# Altium footprint library sun_library.PcbLib: 412 footprints (part 17 of 26)
Each footprint in its own frame and in the unit in brackets; x right, y up, seen from the top. Pads: shape width x height; smd on the part's side, far side on the other; paste and mask are expansions set on the pad; w line width, h text height; cw(c..) or ccw(c..) is an arc to the next point about the centre after c.
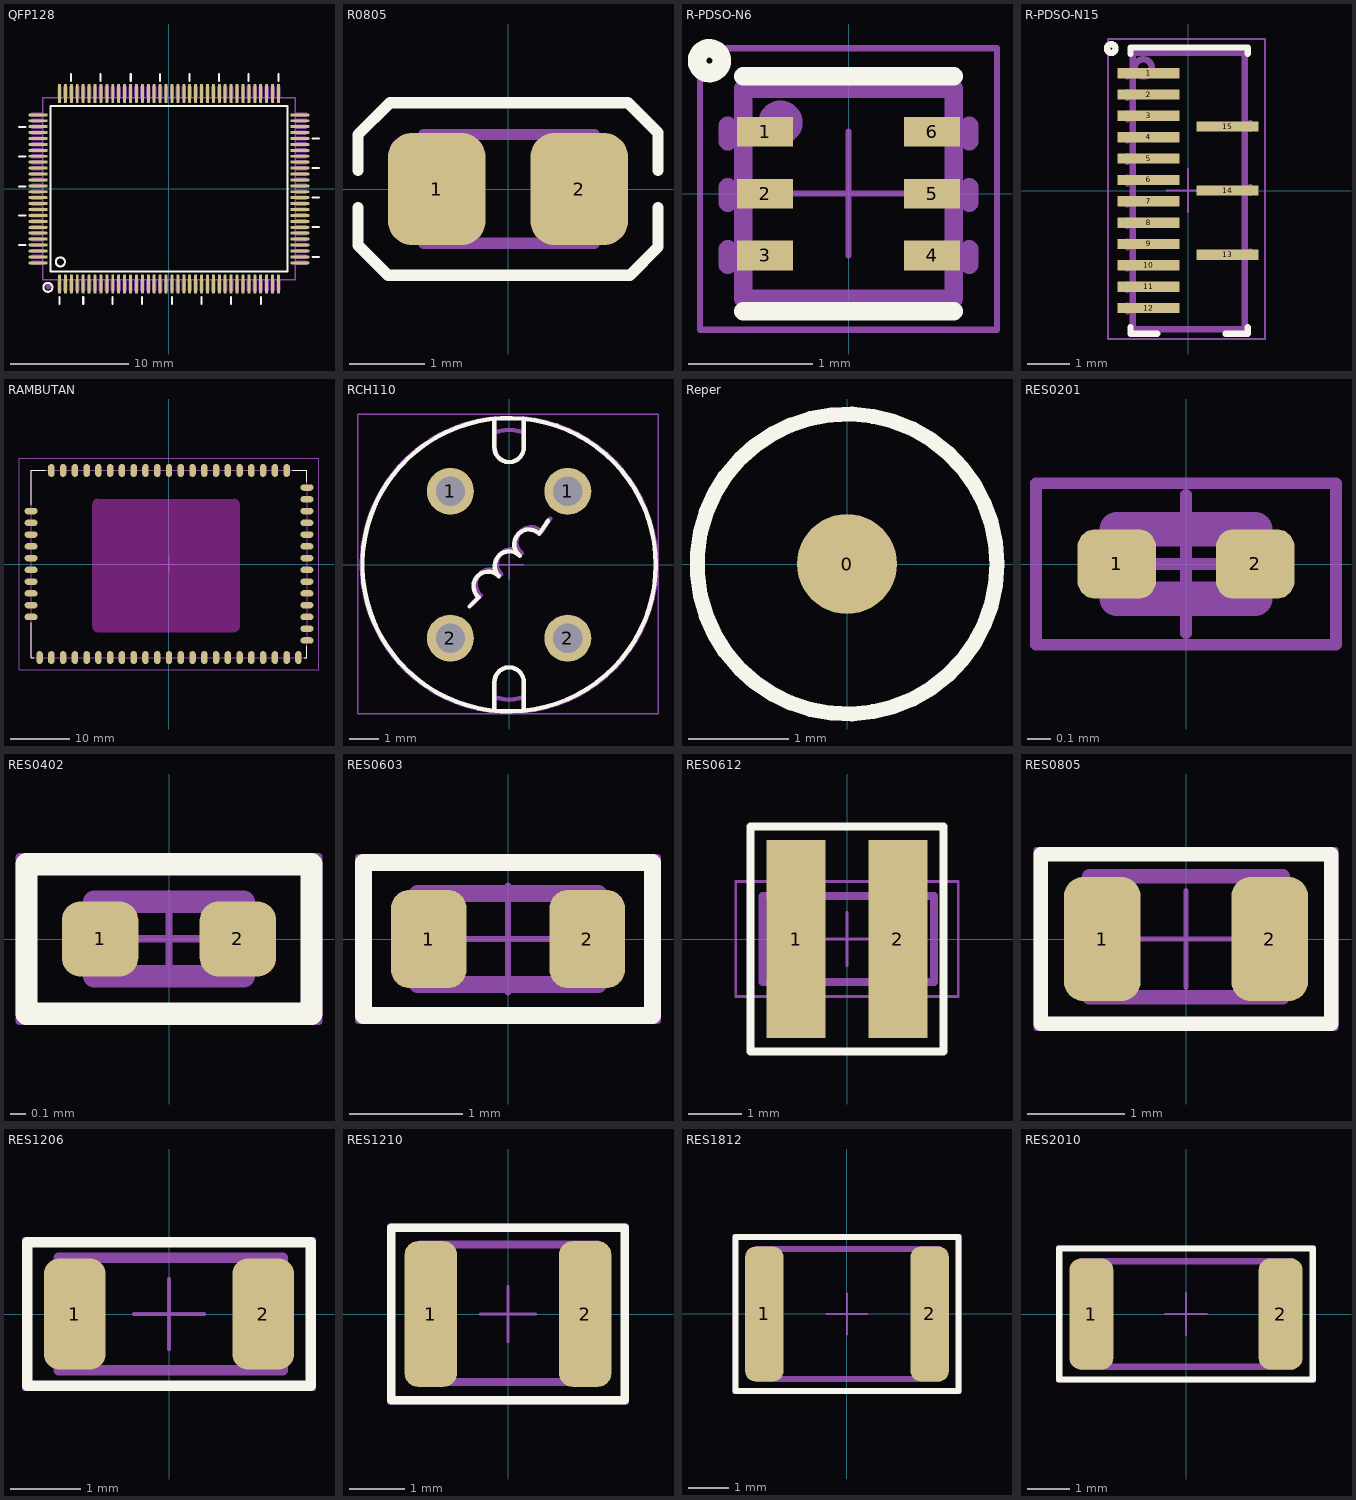
[diagram p16: the footprints below, top view; thin cyan lines are the x and y axes]

## QFP128 [mm]
pads (128):
  rrect50% 0.25x1.6 smd mask+0.075: 1(-9.25,-8.05) 2(-8.75,-8.05) 3(-8.25,-8.05) 4(-7.75,-8.05) 5(-7.25,-8.05) 6(-6.75,-8.05) 7(-6.25,-8.05) 8(-5.75,-8.05) 9(-5.25,-8.05) 10(-4.75,-8.05) 11(-4.25,-8.05) 12(-3.75,-8.05) 13(-3.25,-8.05) 14(-2.75,-8.05) 15(-2.25,-8.05) 16(-1.75,-8.05) 17(-1.25,-8.05) 18(-0.75,-8.05) 19(-0.25,-8.05) 20(0.25,-8.05) 21(0.75,-8.05) 22(1.25,-8.05) 23(1.75,-8.05) 24(2.25,-8.05) 25(2.75,-8.05) 26(3.25,-8.05) 27(3.75,-8.05) 28(4.25,-8.05) 29(4.75,-8.05) 30(5.25,-8.05) 31(5.75,-8.05) 32(6.25,-8.05) 33(6.75,-8.05) 34(7.25,-8.05) 35(7.75,-8.05) 36(8.25,-8.05) 37(8.75,-8.05) 38(9.25,-8.05) 65(9.25,8.05) 66(8.75,8.05) 67(8.25,8.05) 68(7.75,8.05) 69(7.25,8.05) 70(6.75,8.05) 71(6.25,8.05) 72(5.75,8.05) 73(5.25,8.05) 74(4.75,8.05) 75(4.25,8.05) 76(3.75,8.05) 77(3.25,8.05) 78(2.75,8.05) 79(2.25,8.05) 80(1.75,8.05) 81(1.25,8.05) 82(0.75,8.05) 83(0.25,8.05) 84(-0.25,8.05) 85(-0.75,8.05) 86(-1.25,8.05) 87(-1.75,8.05) 88(-2.25,8.05) 89(-2.75,8.05) 90(-3.25,8.05) 91(-3.75,8.05) 92(-4.25,8.05) 93(-4.75,8.05) 94(-5.25,8.05) 95(-5.75,8.05) 96(-6.25,8.05) 97(-6.75,8.05) 98(-7.25,8.05) 99(-7.75,8.05) 100(-8.25,8.05) 101(-8.75,8.05) 102(-9.25,8.05)
  rrect50% 1.6x0.25 smd mask+0.075: 39(11.05,-6.25) 40(11.05,-5.75) 41(11.05,-5.25) 42(11.05,-4.75) 43(11.05,-4.25) 44(11.05,-3.75) 45(11.05,-3.25) 46(11.05,-2.75) 47(11.05,-2.25) 48(11.05,-1.75) 49(11.05,-1.25) 50(11.05,-0.75) 51(11.05,-0.25) 52(11.05,0.25) 53(11.05,0.75) 54(11.05,1.25) 55(11.05,1.75) 56(11.05,2.25) 57(11.05,2.75) 58(11.05,3.25) 59(11.05,3.75) 60(11.05,4.25) 61(11.05,4.75) 62(11.05,5.25) 63(11.05,5.75) 64(11.05,6.25) 103(-11.05,6.25) 104(-11.05,5.75) 105(-11.05,5.25) 106(-11.05,4.75) 107(-11.05,4.25) 108(-11.05,3.75) 109(-11.05,3.25) 110(-11.05,2.75) 111(-11.05,2.25) 112(-11.05,1.75) 113(-11.05,1.25) 114(-11.05,0.75) 115(-11.05,0.25) 116(-11.05,-0.25) 117(-11.05,-0.75) 118(-11.05,-1.25) 119(-11.05,-1.75) 120(-11.05,-2.25) 121(-11.05,-2.75) 122(-11.05,-3.25) 123(-11.05,-3.75) 124(-11.05,-4.25) 125(-11.05,-4.75) 126(-11.05,-5.25) 127(-11.05,-5.75) 128(-11.05,-6.25)
Top Overlay:
  circle w0.178: c-10.23,-8.322 r0.381
  circle w0.178: c-9.175,-6.175 r0.381
  lines w0.178: -12.671,-4.734 -12.137,-4.734 ; -12.671,-2.245 -12.137,-2.245 ; -12.671,0.194 -12.137,0.194 ; -12.671,2.734 -12.137,2.734 ; -12.671,5.223 -12.137,5.223 ; -9.25,-9.728 -9.25,-9.144 ; -8.285,9.111 -8.285,9.696 ; -7.243,-9.728 -7.243,-9.144 ; -5.77,9.111 -5.77,9.696 ; -4.779,-9.728 -4.779,-9.144 ; -3.23,9.111 -3.23,9.696 ; -2.265,-9.728 -2.265,-9.144 ; -0.766,9.111 -0.766,9.696 ; 0.25,-9.728 0.25,-9.144 ; 1.748,9.111 1.748,9.696 ; 2.739,-9.728 2.739,-9.144 ; 4.212,9.111 4.212,9.696 ; 5.228,-9.728 5.228,-9.144 ; 6.727,9.111 6.727,9.696 ; 7.768,-9.728 7.768,-9.144 ; 9.241,9.111 9.241,9.696 ; 12.14,-5.75 12.673,-5.75 ; 12.14,-3.236 12.673,-3.236 ; 12.14,-0.746 12.673,-0.746 ; 12.14,1.768 12.673,1.768 ; 12.14,4.257 12.673,4.257 ; -10,-7 10,-7 10,7 -10,7 -10,-7
TopAssy 13:
  drawing of 518 lines, arcs and shapes, not listed
3D body "SW3dPS-PQFP128.STEP": height 2.82, standoff -0.06, extent -11.601,-8.601 11.601,8.601

## R0805 [mm]
pads (2):
  rrect50% 1.3x1.5 smd: 1(-0.95,0) 2(0.95,0)
Top Overlay:
  lines w0.15: -2,-0.25 -2,-0.75 -1.6,-1.15 0.4,-1.15 1.625,-1.15 2,-0.775 2,-0.25 ; -2,0.25 -2,0.725 -1.575,1.15 0.4,1.15 1.6,1.15 2,0.75 2,0.25
TopAssy 13:
  rectangle: -1.125,-0.725 -0.6,0.725
  rectangle: 0.625,-0.725 1.15,0.725
  lines w0.15: -1.125,-0.725 -1.125,0.725 1.15,0.725 1.15,-0.725 -1.125,-0.725

## R-PDSO-N6 [mm] "SON, 6-Leads, Body 1,6x1,2mm, Pitch 0,50mm"
height 0.55
pads (6):
  rect 0.45x0.24 smd mask+0.075: 1(-0.675,0.5) 2(-0.675,0) 3(-0.675,-0.5) 4(0.675,-0.5) 5(0.675,0) 6(0.675,0.5)
Top Overlay:
  circle w0.15: c-1.125,1.075 r0.1
  lines w0.15: -0.85,-0.95 0.85,-0.95 ; -0.85,0.95 0.85,0.95
TopAssy 13:
  circle w0.15: c-0.55,0.575 r0.103
  lines w0.15: -0.975,-0.575 -0.975,-0.45 ; -0.975,-0.075 -0.975,0.05 ; -0.975,0.425 -0.975,0.55 ; 0.975,-0.575 0.975,-0.45 ; 0.975,-0.075 0.975,0.05 ; 0.975,0.425 0.975,0.55 ; -0.85,-0.85 0.85,-0.85 0.85,0.85 -0.85,0.85 -0.85,-0.85
CourtTop 15:
  lines w0.05: -0.5,0 0.5,0 ; 0,-0.5 0,0.5 ; -1.2,-1.1 1.2,-1.1 1.2,1.175 -1.2,1.175 -1.2,-1.1
3D body "User Library-R-PDSO-N6.step": height 0.6, standoff 0, extent -0.85,-0.85 0.85,0.85

## R-PDSO-N15 [mm] "SON, 15-Leads, Body 6,5x2,5mm, Pitch 0,50mm"
height 0.75
pads (15):
  rect 1.45x0.24 smd mask+0.075: 1(-0.925,2.75) 2(-0.925,2.25) 3(-0.925,1.75) 4(-0.925,1.25) 5(-0.925,0.75) 6(-0.925,0.25) 7(-0.925,-0.25) 8(-0.925,-0.75) 9(-0.925,-1.25) 10(-0.925,-1.75) 11(-0.925,-2.25) 12(-0.925,-2.75) 13(0.925,-1.5) 14(0.925,0) 15(0.925,1.5)
Top Overlay:
  circle w0.15: c-1.8,3.325 r0.1
  lines w0.15: -1.35,-3.2 -1.35,-3.35 -0.725,-3.35 ; -1.35,3.2 -1.35,3.35 1.4,3.35 1.4,3.2 ; 0.875,-3.35 1.4,-3.35 1.4,-3.2
TopAssy 13:
  circle w0.15: c-1.05,2.875 r0.2
  lines w0.15: -1.425,-2.825 -1.425,-2.7 ; -1.425,-2.325 -1.425,-2.2 ; -1.425,-1.825 -1.425,-1.7 ; -1.425,-1.325 -1.425,-1.2 ; -1.425,-0.825 -1.425,-0.7 ; -1.425,-0.325 -1.425,-0.2 ; -1.425,0.175 -1.425,0.3 ; -1.425,0.675 -1.425,0.8 ; -1.425,1.175 -1.425,1.3 ; -1.425,1.675 -1.425,1.8 ; -1.425,2.175 -1.425,2.3 ; -1.425,2.675 -1.425,2.8 ; 1.45,-1.55 1.45,-1.425 ; 1.45,-0.05 1.45,0.075 ; 1.45,1.45 1.45,1.575 ; -1.3,-3.25 -1.3,3.225 1.325,3.225 1.325,-3.25 -1.3,-3.25
CourtTop 15:
  lines w0.05: -0.5,0 0.5,0 ; 0,-0.5 0,0.5 ; -1.875,-3.475 -1.875,3.55 1.8,3.55 1.8,-3.475 -1.875,-3.475
3D body "User Library-R-PDSO-N15.STEP": height 0.81, standoff 0, extent -1.275,-3.25 1.325,3.25

## RAMBUTAN [mm]
pads (68):
  rrect100% 1.1x2.2 smd paste+0.05: 1(-22,-15.9) 2(-20,-15.9) 3(-18,-15.9) 4(-16,-15.9) 5(-14,-15.9) 6(-12,-15.9) 7(-10,-15.9) 8(-8,-15.9) 9(-6,-15.9) 10(-4,-15.9) 11(-2,-15.9) 12(0,-15.9) 13(2,-15.9) 14(4,-15.9) 15(6,-15.9) 16(8,-15.9) 17(10,-15.9) 18(12,-15.9) 19(14,-15.9) 20(16,-15.9) 21(18,-15.9) 22(20,-15.9) 23(22,-15.9) 38(20,15.9) 39(18,15.9) 40(16,15.9) 41(14,15.9) 42(12,15.9) 43(10,15.9) 44(8,15.9) 45(6,15.9) 46(4,15.9) 47(2,15.9) 48(0,15.9) 49(-2,15.9) 50(-4,15.9) 51(-6,15.9) 52(-8,15.9) 53(-10,15.9) 54(-12,15.9) 55(-14,15.9) 56(-16,15.9) 57(-18,15.9) 58(-20,15.9)
  rrect100% 2.2x1.1 smd paste+0.05: 24(23.45,-13) 25(23.45,-11) 26(23.45,-9) 27(23.45,-7) 28(23.45,-5) 29(23.45,-3) 30(23.45,-1) 31(23.45,1) 32(23.45,3) 33(23.45,5) 34(23.45,7) 35(23.45,9) 36(23.45,11) 37(23.45,13) 59(-23.45,9) 60(-23.45,7) 61(-23.45,5) 62(-23.45,3) 63(-23.45,1) 64(-23.45,-1) 65(-23.45,-3) 66(-23.45,-5) 67(-23.45,-7) 68(-23.45,-9)
Top Overlay:
  lines w0.1: -23.449,-10 -23.449,-15.903 -23,-15.903 ; -23.449,10.051 -23.449,15.933 -21,15.933 ; 21,15.933 23.455,15.933 23.455,14 ; 23,-15.903 23.455,-15.903 23.455,-14
Top Paste:
  drawing of 72 lines, arcs and shapes, not listed
Keep-Out Layer:
  board cut-out: -13,-10.5 -13,10 -13,10.098 -12.962,10.292 -12.886,10.474 -12.777,10.637 -12.637,10.777 -12.474,10.886 -12.292,10.962 -12.098,11 -12,11 11,11 11.098,11 11.292,10.962 11.474,10.886 11.637,10.777 11.777,10.637 11.886,10.474 11.962,10.292 12,10.098 12,10 12,-10.5 12,-10.598 11.962,-10.792 11.886,-10.974 11.777,-11.137 11.637,-11.277 11.474,-11.386 11.292,-11.462 11.098,-11.5 11,-11.5 -12,-11.5 -12.098,-11.5 -12.292,-11.462 -12.474,-11.386 -12.637,-11.277 -12.777,-11.137 -12.886,-10.974 -12.962,-10.792 -13,-10.598
Keep-Out Layer:
  lines w0.15: -13,-10.633 -13,10.001 ; -13,-10.608 ccw(c-12.153,-10.633) -12.033,-11.473 ; -12.992,10.001 cw(c-12.125,10.125) -12.098,11 11,11 ; -12.098,-11.481 11.127,-11.481 ; -12.031,-11.472 -12.001,-11.468 ; 11.001,10.992 cw(c11.125,10.125) 12,10.098 12,-10.482 ; 11.1,-11.481 ccw(c11.127,-10.606) 11.993,-10.482
TopAssy 13:
  drawing of 3590 lines, arcs and shapes, not listed
CourtTop 15:
  lines w0.05: 0,-1.5 0,1.5 0,0 ; 0,0 1.5,0 -1.5,0 0,0 ; -25.5,-18 25.5,-18 25.5,18 -25.5,18 -25.5,-18
3D body "Rambutan.STEP": height 3.52, standoff -0.9, extent -23.45,-15.9 23.45,15.9

## RCH110 [mm]
pads (4):
  round 1.6 hole 1: 1(-2,2.5) 1(2,2.5) 2(-2,-2.5) 2(2,-2.5)
Top Overlay:
  circle w0.15: c0,0 r5
  lines w0.15: -1.351,-1.424 -1.04,-1.114 ; -1.066,-1.089 cw(c-0.713,-0.736) -0.359,-0.382 ; -0.5,-4.9 -0.5,-4 cw(c0,-4) 0.5,-4 0.5,-4.9 ; -0.5,4.9 -0.5,4 ccw(c0,4) 0.5,4 0.5,4.9 ; -0.345,-0.397 cw(c0.009,-0.044) 0.362,0.31 ; 0.321,0.346 cw(c0.675,0.7) 1.029,1.054 1.164,1.256 1.163,1.258 1.325,1.5
TopAssy 13:
  lines w0.15: -1.276,-1.349 -0.965,-1.039 ; -0.991,-1.014 cw(c-0.638,-0.661) -0.284,-0.307 ; -0.5,-5 -0.5,-4 cw(c0,-4) 0.5,-4 0.5,-5 ; -0.5,5 -0.5,4 ccw(c0,4) 0.5,4 0.5,5 ; -0.499,-5 cw(c0,0) -0.499,5 ; -0.5,-4.5 ccw(c0,-3.3) 0.502,-4.499 ; -0.5,4.5 cw(c0,3.3) 0.502,4.499 ; -0.27,-0.322 cw(c0.084,0.031) 0.437,0.385 ; 0.396,0.421 cw(c0.75,0.775) 1.104,1.129 1.239,1.331 1.238,1.333 1.4,1.575 ; 0.508,-4.999 ccw(c0,0) 0.508,4.999
CourtTop 15:
  lines w0.05: -0.5,0 0.5,0 ; 0,-0.5 0,0.5 ; -5.15,-5.075 -5.15,5.125 5.075,5.125 5.075,-5.075 -5.15,-5.075
3D body "Coilcraft-RFB0807.step": height 7.5, standoff -3.5, extent -6.223,-6.523 6.223,5.922

## Reper [mm]
pads (1):
  round 1 smd: 0(0,0)
Top Overlay:
  circle w0.15: c0,0 r1.5

## RES0201 [mm] "Chip Resistor Body 0.6x0.3mm, IPC High Density"
height 0.23
pads (2):
  rrect50% 0.34x0.3 smd paste-0.01 mask+0.05: 1(-0.3,0) 2(0.3,0)
TopAssy 13:
  lines w0.15: -0.3,-0.15 0.3,-0.15 0.3,0.15 -0.3,0.15 -0.3,-0.15
CourtTop 15:
  lines w0.05: -0.3,0 0.3,0 ; 0,-0.3 0,0.3 ; -0.65,-0.35 0.65,-0.35 0.65,0.35 -0.65,0.35 -0.65,-0.35
3D body "User Library-SMD RESISTOR-0201.step": height 0.22, standoff -0.02, extent -0.3,-0.15 0.3,0.15

## RES0402 [mm] "Chip Resistor Body 1.0x0.5mm, IPC High Density"
height 0.35
pads (2):
  rrect50% 0.51x0.5 smd paste-0.02 mask+0.075: 1(-0.46,0) 2(0.46,0)
Top Overlay:
  lines w0.15: -0.95,-0.5 -0.95,0.5 0.95,0.5 0.95,-0.5 -0.95,-0.5
TopAssy 13:
  lines w0.15: -0.5,-0.25 -0.5,0.25 0.5,0.25 0.5,-0.25 -0.5,-0.25
CourtTop 15:
  lines w0.05: -0.3,0 0.3,0 ; 0,-0.3 0,0.3 ; -1,-0.55 1,-0.55 1,0.55 -1,0.55 -1,-0.55
3D body "User Library-SMD RESISTOR-0402.step": height 0.35, standoff -0.01, extent -0.5,-0.25 0.5,0.25

## RES0603 [mm] "Chip Resistor, Body 1.6x0.8mm, IPC High Density"
height 0.45
pads (2):
  rrect50% 0.67x0.87 smd paste-0.05 mask+0.075: 1(-0.7,0) 2(0.7,0)
Top Overlay:
  lines w0.15: -1.275,-0.675 -1.275,0.675 1.275,0.675 1.275,-0.675 -1.275,-0.675
TopAssy 13:
  lines w0.15: -0.8,-0.4 0.8,-0.4 0.8,0.4 -0.8,0.4 -0.8,-0.4
CourtTop 15:
  lines w0.05: -0.475,0 0.475,0 ; 0,-0.475 0,0.475 ; -1.325,-0.725 1.325,-0.725 1.325,0.725 -1.325,0.725 -1.325,-0.725
3D body "User Library-SMD RESISTOR-0603.step": height 0.45, standoff -0.01, extent -0.8,-0.4 0.8,0.4

## RES0612 [mm] "Chip Resistor, Body 1.6mm x 3.2mm, IPC High Density"
height 0.55
pads (2):
  rect 1.1x3.7 smd: 1(-0.95,0) 2(0.95,0)
Top Overlay:
  lines w0.15: -1.8,-2.1 -1.8,2.1 1.8,2.1 1.8,-2.1 -1.8,-2.1
Top Solder:
  rectangle: -1.5,-1.85 -0.4,1.85
TopAssy 13:
  lines w0.15: -1.575,-0.8 1.625,-0.8 1.625,0.8 -1.575,0.8 -1.575,-0.8
CourtTop 15:
  lines w0.05: -0.5,0 0.5,0 ; 0,-0.5 0,0.5 ; -2.075,-1.075 2.075,-1.075 2.075,1.075 -2.075,1.075 -2.075,-1.075
3D body "User Library-wk732b.step": height 0.61, standoff 0, extent -0.8,-1.6 0.8,1.6

## RES0805 [mm] "Chip Resistor, Body 2.0x1.25mm, IPC High Density"
height 0.5
pads (2):
  rrect50% 0.79x1.28 smd: 1(-0.865,0) 2(0.865,0)
Top Overlay:
  lines w0.15: -1.5,-0.875 -1.5,0.875 1.5,0.875 1.5,-0.875 -1.5,-0.875
TopAssy 13:
  lines w0.15: -1,-0.6 -1,0.65 1,0.65 1,-0.6 -1,-0.6
CourtTop 15:
  lines w0.05: -0.5,0 0.5,0 ; 0,-0.5 0,0.5 ; -1.55,-0.925 -1.55,0.925 1.55,0.925 1.55,-0.925 -1.55,-0.925
3D body "User Library-SMD RESISTOR-0805.step": height 0.6, standoff 0, extent -1,-0.625 1,0.625

## RES1206 [mm] "Chip Resistor, Body 3.1x1.6mm, IPC High Density"
height 0.55
pads (2):
  rrect50% 0.88x1.59 smd: 1(-1.345,0) 2(1.345,0)
Top Overlay:
  lines w0.15: -2.025,-1.025 -2.025,1.025 2.025,1.025 2.025,-1.025 -2.025,-1.025
TopAssy 13:
  lines w0.15: -1.575,-0.8 1.625,-0.8 1.625,0.8 -1.575,0.8 -1.575,-0.8
CourtTop 15:
  lines w0.05: -0.5,0 0.5,0 ; 0,-0.5 0,0.5 ; -2.075,-1.075 2.075,-1.075 2.075,1.075 -2.075,1.075 -2.075,-1.075
3D body "User Library-SMD RESISTOR-1206.step": height 0.6, standoff 0, extent -1.575,-0.8 1.625,0.8

## RES1210 [mm] "Chip Resistor, Body 3.1x2.6mm, IPC High Density"
height 0.5
pads (2):
  rrect50% 0.94x2.62 smd: 1(-1.39,0) 2(1.39,0)
Top Overlay:
  lines w0.15: -2.1,-1.55 2.1,-1.55 2.1,1.55 -2.1,1.55 -2.1,-1.55
TopAssy 13:
  lines w0.15: -1.575,-1.225 1.625,-1.225 1.625,1.25 -1.575,1.25 -1.575,-1.225
CourtTop 15:
  lines w0.05: -0.5,0 0.5,0 ; 0,-0.5 0,0.5 ; -2.15,-1.6 2.15,-1.6 2.15,1.6 -2.15,1.6 -2.15,-1.6
3D body "User Library-SMD RESISTOR-1210.step": height 0.6, standoff 0, extent -1.6,-1.25 1.6,1.25

## RES1812 [mm] "Chip Resistor, Body 4.6x3.1mm, IPC High Density"
height 0.55
pads (2):
  rrect50% 0.94x3.32 smd: 1(-2.04,0) 2(2.04,0)
Top Overlay:
  lines w0.15: -2.75,-1.9 -2.75,1.9 2.75,1.9 2.75,-1.9 -2.75,-1.9
TopAssy 13:
  lines w0.15: -2.225,-1.6 2.275,-1.6 2.275,1.6 -2.225,1.6 -2.225,-1.6
CourtTop 15:
  lines w0.05: -0.5,0 0.5,0 ; 0,-0.5 0,0.5 ; -2.8,-1.95 2.8,-1.95 2.8,1.95 -2.8,1.95 -2.8,-1.95
3D body "User Library-SMD RESISTOR-1812.step": height 0.6, standoff 0, extent -2.25,-1.6 2.25,1.6

## RES2010 [mm] "Chip Resistor, Body 5.0x2.5mm, IPC High Density"
height 0.55
pads (2):
  rrect50% 1.04x2.62 smd: 1(-2.24,0) 2(2.24,0)
Top Overlay:
  lines w0.15: -3,-1.55 -3,1.55 3,1.55 3,-1.55 -3,-1.55
TopAssy 13:
  lines w0.15: -2.475,-1.25 2.525,-1.25 2.525,1.25 -2.475,1.25 -2.475,-1.25
CourtTop 15:
  lines w0.05: -0.5,0 0.5,0 ; 0,-0.5 0,0.5 ; -3.05,-1.6 3.05,-1.6 3.05,1.6 -3.05,1.6 -3.05,-1.6
3D body "User Library-SMD RESISTOR-2010.step": height 0.6, standoff 0, extent -2.5,-1.25 2.5,1.25